# Altium footprint library MyPcbLib.PcbLib: 657 footprints (part 35 of 42)
Each footprint in its own frame and in the unit in brackets; x right, y up, seen from the top. Pads: shape width x height; smd on the part's side, far side on the other; paste and mask are expansions set on the pad; w line width, h text height; cw(c..) or ccw(c..) is an arc to the next point about the centre after c.
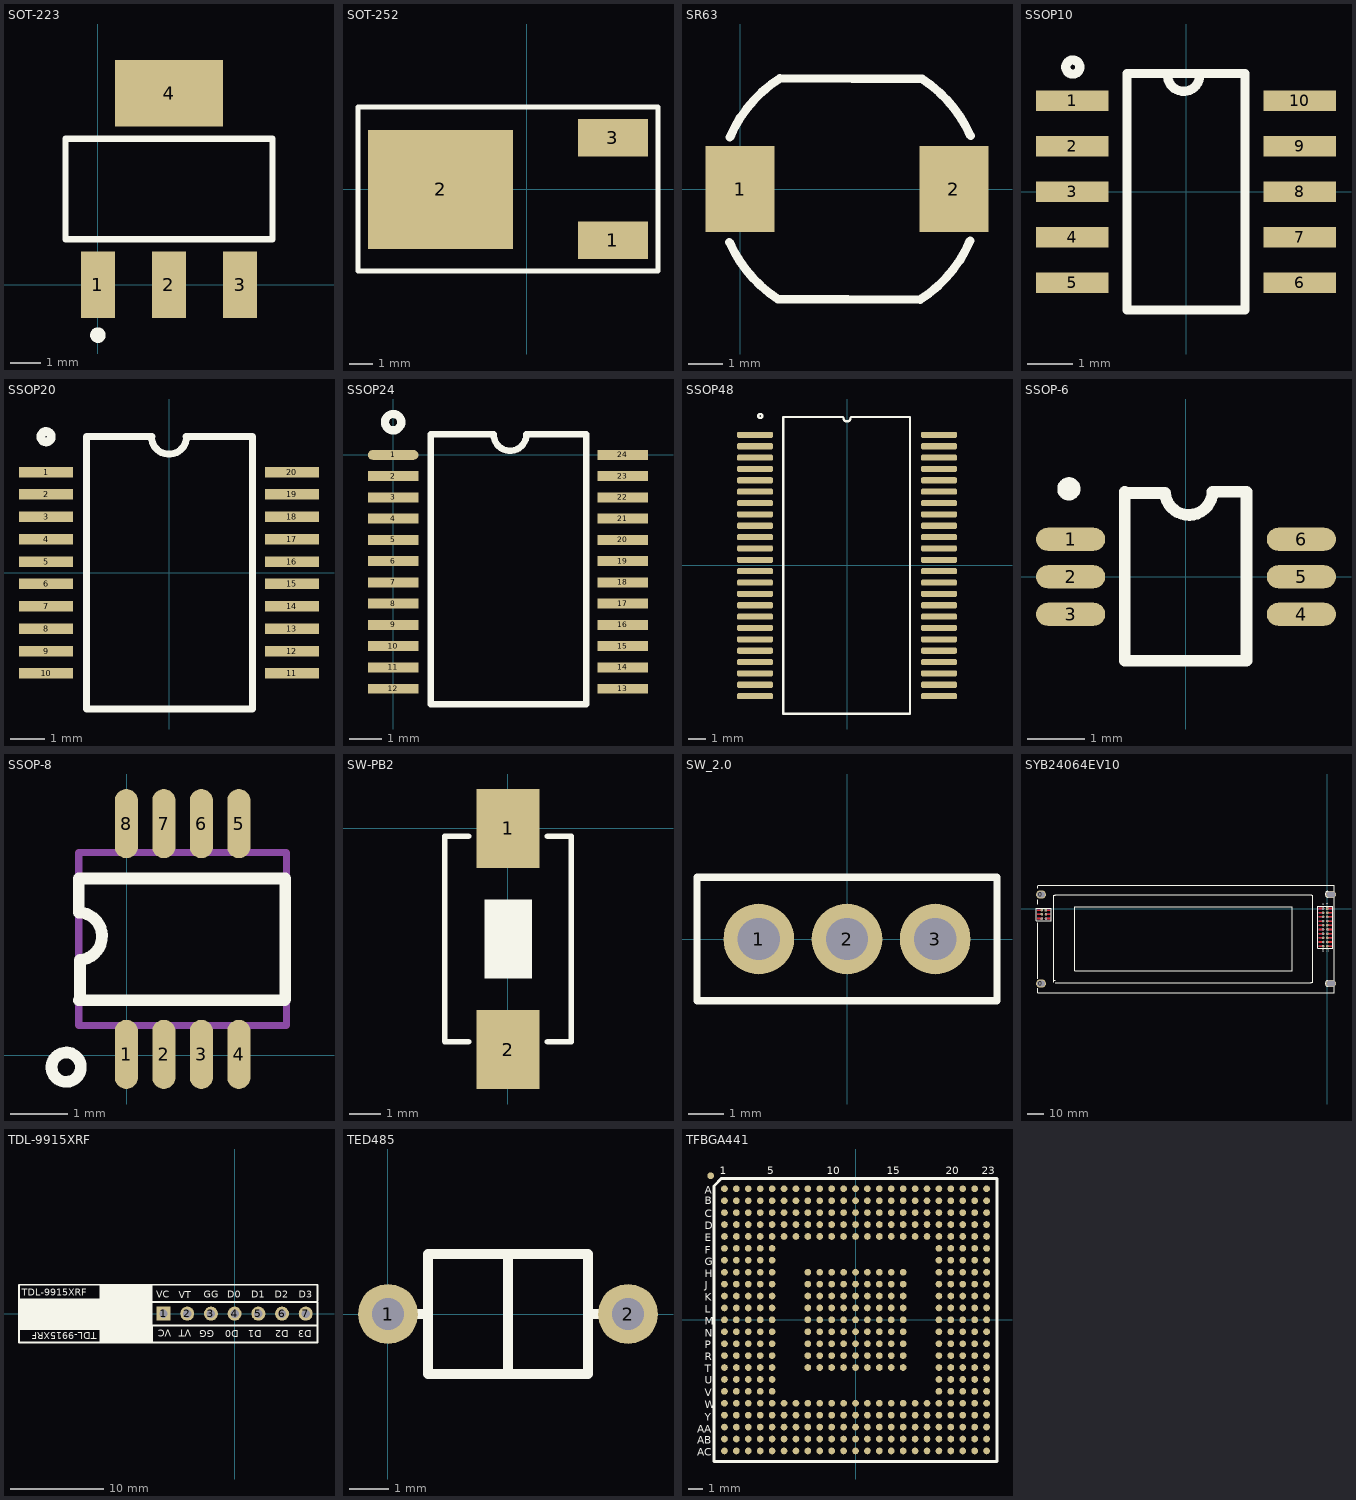
[diagram p34: the footprints below, top view; thin cyan lines are the x and y axes]

## SOT-223 [mm]
pads (4):
  rect 1.1x2.15 smd: 1(0,0) 2(2.3,0) 3(4.6,0)
  rect 3.5x2.15 smd: 4(2.3,6.2)
Top Overlay:
  circle w0.25: c0,-1.625 r0.125
  lines w0.2: -1.05,1.475 -1.05,4.725 5.65,4.725 5.65,1.475 -1.05,1.475
3D body: height 1.65, standoff -0.03, extent -0.951,-0.48 5.549,6.48

## SOT-252 [mm]
pads (3):
  rect 3x1.6 smd: 1(3.677,-2.184) 3(3.677,2.184)
  rect 6.2x5.08 smd: 2(-3.677,-0.013)
Top Overlay:
  lines w0.203: 5.6,-3.5 -7.2,-3.5 -7.2,3.5 5.6,3.5 ; 5.6,-3.454 5.6,3.454

## SR63 [mil]
pads (2):
  rect 80x100 smd: 1(0,0) 2(248.03,0)
Top Overlay:
  lines w10: -12.42,-61.6 ccw(c126.88,0) 43.69,-127.59 208.93,-128.33 ccw(c126.88,0) 266.88,-60 ; -11.88,60 cw(c128.12,0) 46.07,128.33 211.31,127.59 cw(c128.12,0) 267.42,61.6

## SS01 [mm]

## SSOP10 [mm]
pads (10):
  rect 1.6x0.45 smd: 1(-2.5,2) 2(-2.5,1) 3(-2.5,0) 4(-2.5,-1) 5(-2.5,-2) 6(2.5,-2) 7(2.5,-1) 8(2.5,0) 9(2.5,1) 10(2.5,2)
Top Overlay:
  circle w0.203: c-2.489,2.743 r0.155
  lines w0.203: -0.405,2.595 ccw(c-0.051,2.565) 0.305,2.565 ; -1.295,-2.6 -1.295,2.6 1.295,2.6 1.295,-2.6 -1.295,-2.6

## SSOP20 [mil]
pads (20):
  rect 62x12 smd: 1(-140.5,115.16) 2(-140.5,89.57) 3(-140.5,63.98) 4(-140.5,38.39) 5(-140.5,12.8) 6(-140.5,-12.8) 7(-140.5,-38.39) 8(-140.5,-63.98) 9(-140.5,-89.57) 10(-140.5,-115.16) 11(140.5,-115.16) 12(140.5,-89.57) 13(140.5,-63.98) 14(140.5,-38.39) 15(140.5,-12.8) 16(140.5,12.8) 17(140.5,38.39) 18(140.5,63.98) 19(140.5,89.57) 20(140.5,115.16)
Top Overlay:
  circle w10: c-140.5,155.51 r5.91
  lines w8: -20,155.51 ccw(c0,155.51) 20,155.51 ; -19.5,155.51 -94.5,155.51 -94.5,-155.51 95.5,-155.51 95.5,155.51 19.68,155.51

## SSOP24 [mil]
pads (24):
  oval 62x12 smd: 1(0,0)
  rect 62x12 smd: 2(0,-26) 3(0,-52) 4(0,-78) 5(0,-104) 6(0,-130) 7(0,-156) 8(0,-182) 9(0,-208) 10(0,-234) 11(0,-260) 12(0,-286) 13(281,-286) 14(281,-260) 15(281,-234) 16(281,-208) 17(281,-182) 18(281,-156) 19(281,-130) 20(281,-104) 21(281,-78) 22(281,-52) 23(281,-26) 24(281,0)
Top Overlay:
  circle w10: c0,40 r10
  lines w8: 121,25 46,25 46,-305 236,-305 236,25 166,25 ; 123,25 ccw(c143,25) 163,25

## SSOP48 [mil]
pads (48):
  rrect50% 78.74x13.5 smd: 1(-202.5,287.5) 2(-202.5,262.5) 3(-202.5,237.5) 4(-202.5,212.5) 5(-202.5,187.5) 6(-202.5,162.5) 7(-202.5,137.5) 8(-202.5,112.5) 9(-202.5,87.5) 10(-202.5,62.5) 11(-202.5,37.5) 12(-202.5,12.5) 13(-202.5,-12.5) 14(-202.5,-37.5) 15(-202.5,-62.5) 16(-202.5,-87.5) 17(-202.5,-112.5) 18(-202.5,-137.5) 19(-202.5,-162.5) 20(-202.5,-187.5) 21(-202.5,-212.5) 22(-202.5,-237.5) 23(-202.5,-262.5) 24(-202.5,-287.5) 25(202.5,-287.5) 26(202.5,-262.5) 27(202.5,-237.5) 28(202.5,-212.5) 29(202.5,-187.5) 30(202.5,-162.5) 31(202.5,-137.5) 32(202.5,-112.5) 33(202.5,-87.5) 34(202.5,-62.5) 35(202.5,-37.5) 36(202.5,-12.5) 37(202.5,12.5) 38(202.5,37.5) 39(202.5,62.5) 40(202.5,87.5) 41(202.5,112.5) 42(202.5,137.5) 43(202.5,162.5) 44(202.5,187.5) 45(202.5,212.5) 46(202.5,237.5) 47(202.5,262.5) 48(202.5,287.5)
Top Overlay:
  circle w5: c-191,329 r4.47
  lines w5: -140.5,-326.67 -140.5,326.87 ; -140,327 -9,327 ; -139.5,-326.5 138.5,-326.5 ; -7.87,325 ccw(c0,325) 7.87,325 ; 9,327 138,327 ; 138.72,-326.67 138.72,326.87

## SSOP-6 [mm]
pads (6):
  oval 1.2x0.4 smd: 1(-2,0.65) 2(-2,0) 3(-2,-0.65) 4(2,-0.65) 5(2,0) 6(2,0.65)
Top Overlay:
  circle w0.203: c-2.03,1.524 r0.1
  lines w0.203: -1.06,-1.453 -1.06,1.475 ; -1.05,-1.453 1.05,-1.453 1.05,1.475 0.46,1.475 cw(c0.048,1.484) -0.363,1.453 -1.038,1.453

## SSOP-8 [mm]
pads (8):
  oval 0.4x1.2 smd: 1(-0.01,0.012) 2(0.64,0.012) 3(1.29,0.012) 4(1.94,0.012) 5(1.94,4.012) 6(1.29,4.012) 7(0.64,4.012) 8(-0.01,4.012)
Top Overlay:
  circle w0.203: c-1.053,-0.21 r0.254
  lines w0.203: -0.835,0.952 2.735,0.952 ; -0.813,0.974 -0.813,1.649 ccw(c-0.844,2.06) -0.835,2.472 -0.835,3.062 2.745,3.062 2.745,0.962
Mechanical 1:
  lines w0.127: -0.835,0.512 -0.835,3.512 2.765,3.512 2.765,0.512 -0.835,0.512

## SW-PB2 [mm]
pads (2):
  rect 2x2.5 smd: 1(0.007,-0.002) 2(0.007,-7.002)
Top Overlay:
  region: -0.74,-2.249 -0.74,-4.749 0.76,-4.749 0.76,-2.249
  lines w0.178: -1.243,-6.752 -1.993,-6.748 -1.993,-0.252 -1.243,-0.252 ; 1.257,-6.752 2.007,-6.752 2.007,-0.252 1.257,-0.252

## SW_2.0 [mm]
pads (3):
  round 2 hole 1.2: 1(-2.5,0) 2(0,0) 3(2.5,0)
Top Overlay:
  lines w0.203: -4.25,-1.75 -4.25,1.75 4.25,1.75 4.25,-1.75 -4.25,-1.75

## SYB24064EV10 [mil]
pads (30):
  oval 236.22x196.85 hole 137.8 slot 177.17 at 0 deg: 0(-6839.57,-1791.81) 0(-6839.57,334.17)
  round 60 hole 42: 0(-6819,-139.37) 0(-6719,-139.37) 2(-100,0) 3(0,-100) 4(-100,-100) 5(0,-200) 6(-100,-200) 7(0,-300) 8(-100,-300) 9(0,-400) 10(-100,-400) 11(0,-500) 12(-100,-500) 13(0,-600) 14(-100,-600) 15(0,-700) 16(-100,-700) 17(0,-800) 18(-100,-800) 19(0,-900) 20(-100,-900) 21(-6819,-39.37) 22(-6819,-239.37) 22(-6719,-239.37)
  oval 236.22x157.48 hole 137.8 slot 196.85 at 0 deg: 0(89.57,-1791.81) 0(89.57,334.17)
  rect 60x60 hole 42: 1(0,0) 21(-6719,-39.37)
Top Layer:
  rectangle: -211,-21 -81,19
  rectangle: -211,-120.89 -81,-80.89
  rectangle: -211,-320.67 -81,-280.67
  rectangle: -211,-220.78 -81,-180.78
  rectangle: -211,-620.33 -81,-580.33
  rectangle: -211,-720.22 -81,-680.22
  rectangle: -211,-520.44 -81,-480.44
  rectangle: -211,-420.56 -81,-380.56
  rectangle: -211,-920 -81,-880
  rectangle: -211,-820.11 -81,-780.11
  rectangle: -20,-820.11 110,-780.11
  rectangle: -20,-920 110,-880
  rectangle: -20,-420.56 110,-380.56
  rectangle: -20,-520.44 110,-480.44
  rectangle: -20,-720.22 110,-680.22
  rectangle: -20,-620.33 110,-580.33
  rectangle: -20,-220.78 110,-180.78
  rectangle: -20,-320.67 110,-280.67
  rectangle: -20,-120.89 110,-80.89
  rectangle: -20,-21 110,19
  rectangle: -6930,-60.37 -6800,-20.37
  rectangle: -6930,-160.26 -6800,-120.26
  rectangle: -6930,-260.15 -6800,-220.15
  rectangle: -6739,-260.15 -6609,-220.15
  rectangle: -6739,-160.26 -6609,-120.26
  rectangle: -6739,-60.37 -6609,-20.37
Bottom Layer:
  rectangle: -20,-21 110,19
  rectangle: -20,-120.89 110,-80.89
  rectangle: -20,-320.67 110,-280.67
  rectangle: -20,-220.78 110,-180.78
  rectangle: -20,-620.33 110,-580.33
  rectangle: -20,-720.22 110,-680.22
  rectangle: -20,-520.45 110,-480.45
  rectangle: -20,-420.56 110,-380.56
  rectangle: -20,-920 110,-880
  rectangle: -20,-820.11 110,-780.11
  rectangle: -211,-820.11 -81,-780.11
  rectangle: -211,-920 -81,-880
  rectangle: -211,-420.56 -81,-380.56
  rectangle: -211,-520.45 -81,-480.45
  rectangle: -211,-720.22 -81,-680.22
  rectangle: -211,-620.33 -81,-580.33
  rectangle: -211,-220.78 -81,-180.78
  rectangle: -211,-320.67 -81,-280.67
  rectangle: -211,-120.89 -81,-80.89
  rectangle: -211,-21 -81,19
  rectangle: -6739,-60.37 -6609,-20.37
  rectangle: -6739,-160.26 -6609,-120.26
  rectangle: -6739,-260.15 -6609,-220.15
  rectangle: -6930,-260.15 -6800,-220.15
  rectangle: -6930,-160.26 -6800,-120.26
  rectangle: -6930,-60.37 -6800,-20.37
Top Overlay:
  circle w5: c-6839.57,-1791.81 r68.9
  lines w5: -6529,-1762 -6529,315 -6497,315 -6497,325 -376,325 -376,315 -347,315 -347,-1763 -378,-1763 -378,-1771 -6498,-1771 ; -6529,-1709 -6498,-1709 -6498,-1718 ; -6034,42 -6034,-1492 -838,-1492 -838,42 -6032,42
  lines w10: -6920,106.92 -6920,204.92 ; -6920,484.92 -6920,528.92 ; -6918.61,-1906.69 -6918.61,-2007.87 167.32,-2007.87 167.32,551.18 ; -6918.61,-1679.69 -6918.61,-728.35 ; -6918.61,-732.08 -6918.61,-338.69 ; -6918.61,551.18 168,551.18 ; 95,-1721 164.18,-1721 ; 100,-1721 8,-1721 ccw(c8,-1770) -41,-1770 -41,-1809 ccw(c8,-1809) 8,-1858 103,-1858 167.14,-1858 ; 164.18,408 103,408 9,408 ccw(c9,359) -40,359 -40,321 ccw(c9,321) 9,272 104,272 166.18,272 ; -6946.17,-289.37 -6591.83,-289.37 -6591.83,10.63 -6946.17,10.63 -6946.17,-289.37 ; -227.17,-950 127.17,-950 127.17,50 -227.17,50 -227.17,-950
  text "20" at -69,-1048 h50
  text "19" at 33,-1041 h50
  text "1" at 25,87 h50
  text "2" at -74,78 h50
Bottom Overlay:
  text "19" at 33,-961 h50
  text "20" at -69,-968 h50
  text "1" at 25,117 h50
  text "2" at -74,108 h50
Top Paste:
  rectangle: -211,-21 -81,19
  rectangle: -211,-120.89 -81,-80.89
  rectangle: -211,-320.67 -81,-280.67
  rectangle: -211,-220.78 -81,-180.78
  rectangle: -211,-620.33 -81,-580.33
  rectangle: -211,-720.22 -81,-680.22
  rectangle: -211,-520.44 -81,-480.44
  rectangle: -211,-420.56 -81,-380.56
  rectangle: -211,-920 -81,-880
  rectangle: -211,-820.11 -81,-780.11
  rectangle: -20,-820.11 110,-780.11
  rectangle: -20,-920 110,-880
  rectangle: -20,-420.56 110,-380.56
  rectangle: -20,-520.44 110,-480.44
  rectangle: -20,-720.22 110,-680.22
  rectangle: -20,-620.33 110,-580.33
  rectangle: -20,-220.78 110,-180.78
  rectangle: -20,-320.67 110,-280.67
  rectangle: -20,-120.89 110,-80.89
  rectangle: -20,-21 110,19
  rectangle: -6930,-60.37 -6800,-20.37
  rectangle: -6930,-160.26 -6800,-120.26
  rectangle: -6930,-260.15 -6800,-220.15
  rectangle: -6739,-260.15 -6609,-220.15
  rectangle: -6739,-160.26 -6609,-120.26
  rectangle: -6739,-60.37 -6609,-20.37
Bottom Paste:
  rectangle: -20,-21 110,19
  rectangle: -20,-120.89 110,-80.89
  rectangle: -20,-320.67 110,-280.67
  rectangle: -20,-220.78 110,-180.78
  rectangle: -20,-620.33 110,-580.33
  rectangle: -20,-720.22 110,-680.22
  rectangle: -20,-520.45 110,-480.45
  rectangle: -20,-420.56 110,-380.56
  rectangle: -20,-920 110,-880
  rectangle: -20,-820.11 110,-780.11
  rectangle: -211,-820.11 -81,-780.11
  rectangle: -211,-920 -81,-880
  rectangle: -211,-420.56 -81,-380.56
  rectangle: -211,-520.45 -81,-480.45
  rectangle: -211,-720.22 -81,-680.22
  rectangle: -211,-620.33 -81,-580.33
  rectangle: -211,-220.78 -81,-180.78
  rectangle: -211,-320.67 -81,-280.67
  rectangle: -211,-120.89 -81,-80.89
  rectangle: -211,-21 -81,19
  rectangle: -6739,-60.37 -6609,-20.37
  rectangle: -6739,-160.26 -6609,-120.26
  rectangle: -6739,-260.15 -6609,-220.15
  rectangle: -6930,-260.15 -6800,-220.15
  rectangle: -6930,-160.26 -6800,-120.26
  rectangle: -6930,-60.37 -6800,-20.37
Top Solder:
  rectangle: -215,-25 -77,23
  rectangle: -215,-124.89 -77,-76.89
  rectangle: -215,-324.67 -77,-276.67
  rectangle: -215,-224.78 -77,-176.78
  rectangle: -215,-624.33 -77,-576.33
  rectangle: -215,-724.22 -77,-676.22
  rectangle: -215,-524.44 -77,-476.44
  rectangle: -215,-424.56 -77,-376.56
  rectangle: -215,-924 -77,-876
  rectangle: -215,-824.11 -77,-776.11
  rectangle: -24,-824.11 114,-776.11
  rectangle: -24,-924 114,-876
  rectangle: -24,-424.56 114,-376.56
  rectangle: -24,-524.44 114,-476.44
  rectangle: -24,-724.22 114,-676.22
  rectangle: -24,-624.33 114,-576.33
  rectangle: -24,-224.78 114,-176.78
  rectangle: -24,-324.67 114,-276.67
  rectangle: -24,-124.89 114,-76.89
  rectangle: -24,-25 114,23
  rectangle: -6934,-64.37 -6796,-16.37
  rectangle: -6934,-164.26 -6796,-116.26
  rectangle: -6934,-264.15 -6796,-216.15
  rectangle: -6743,-264.15 -6605,-216.15
  rectangle: -6743,-164.26 -6605,-116.26
  rectangle: -6743,-64.37 -6605,-16.37
Bottom Solder:
  rectangle: -24,-25 114,23
  rectangle: -24,-124.89 114,-76.89
  rectangle: -24,-324.67 114,-276.67
  rectangle: -24,-224.78 114,-176.78
  rectangle: -24,-624.33 114,-576.33
  rectangle: -24,-724.22 114,-676.22
  rectangle: -24,-524.45 114,-476.45
  rectangle: -24,-424.56 114,-376.56
  rectangle: -24,-924 114,-876
  rectangle: -24,-824.11 114,-776.11
  rectangle: -215,-824.11 -77,-776.11
  rectangle: -215,-924 -77,-876
  rectangle: -215,-424.56 -77,-376.56
  rectangle: -215,-524.45 -77,-476.45
  rectangle: -215,-724.22 -77,-676.22
  rectangle: -215,-624.33 -77,-576.33
  rectangle: -215,-224.78 -77,-176.78
  rectangle: -215,-324.67 -77,-276.67
  rectangle: -215,-124.89 -77,-76.89
  rectangle: -215,-25 -77,23
  rectangle: -6743,-64.37 -6605,-16.37
  rectangle: -6743,-164.26 -6605,-116.26
  rectangle: -6743,-264.15 -6605,-216.15
  rectangle: -6934,-264.15 -6796,-216.15
  rectangle: -6934,-164.26 -6796,-116.26
  rectangle: -6934,-64.37 -6796,-16.37

## TDL-9915XRF [mm] "TDL-9915XRF"
pads (7):
  rect 1.5x1.5 hole 0.9: 1(-7.62,0)
  round 1.5 hole 0.9: 2(-5.08,0) 3(-2.54,0) 4(0,0) 5(2.54,0) 6(5.08,0) 7(7.62,0)
Top Overlay:
  rectangle: -14.503,-3.175 -8.865,3.105
  rectangle: -23.089,-1.753 -14.097,1.6
  lines w0.2: -8.865,-1.27 8.915,-1.27 ; -8.89,-1.27 -8.89,1.27 8.89,1.27 8.89,-1.27 -8.89,-1.27
  lines w0.203: -8.89,1.394 -8.89,3.105 8.869,3.105 ; -8.865,-3.073 -23.114,-3.073 -23.114,3.105 8.869,3.105 ; -8.865,-1.394 -8.865,-3.105 8.894,-3.105 8.894,-1.402 8.886,-1.394 ; 8.861,1.394 8.869,1.402 8.869,3.105
  text "D3" at 8.28,-2.54 h0.76
  text "D2" at 5.817,-1.803 h0.76
  text "D1" at 2.921,-1.778 h0.76
  text "D0" at 0.457,-1.778 h0.76
  text "GG" at -2.184,-1.778 h0.76
  text "VT" at -4.674,-1.727 h0.76
  text "VC" at -6.782,-1.727 h0.76
  text "VC" at -8.407,1.727 h0.76
  text "VT" at -5.994,1.676 h0.76
  text "GG" at -3.327,1.702 h0.76
  text "D0" at -0.787,1.702 h0.76
  text "D1" at 1.778,1.702 h0.76
  text "D2" at 4.318,1.727 h0.76
  text "D3" at 6.858,1.702 h0.76
  text "TDL-9915XRF" at -22.809,1.905 h0.76
  text "TDL-9915XRF" at -14.757,-1.981 h0.76

## TED485 [mil]
pads (2):
  round 60 hole 32: 1(0.2,0.4) 2(240.2,0.4)
Top Overlay:
  lines w10: 0.2,0.4 40.2,0.4 ; 120.2,-59.6 120.2,60.4 ; 200.2,0.4 240.2,0.4 ; 40.2,-59.6 60.2,-59.6 200.2,-59.6 200.2,60.4 40.2,60.4 40.2,-59.6

## TFBGA441 [mm]
pads (442):
  round 0.45 smd: A1(-8.8,8.8) A2(-8,8.8) A3(-7.2,8.8) A4(-6.4,8.8) A5(-5.6,8.8) A6(-4.8,8.8) A7(-4,8.8) A8(-3.2,8.8) A9(-2.4,8.8) A10(-1.6,8.8) A11(-0.8,8.8) A12(0,8.8) A13(0.8,8.8) A14(1.6,8.8) A15(2.4,8.8) A16(3.2,8.8) A17(4,8.8) A18(4.8,8.8) A19(5.6,8.8) A20(6.4,8.8) A21(7.2,8.8) A22(8,8.8) A23(8.8,8.8) AA1(-8.8,-7.2) AA2(-8,-7.2) AA3(-7.2,-7.2) AA4(-6.4,-7.2) AA5(-5.6,-7.2) AA6(-4.8,-7.2) AA7(-4,-7.2) AA8(-3.2,-7.2) AA9(-2.4,-7.2) AA10(-1.6,-7.2) AA11(-0.8,-7.2) AA12(0,-7.2) AA13(0.8,-7.2) AA14(1.6,-7.2) AA15(2.4,-7.2) AA16(3.2,-7.2) AA17(4,-7.2) AA18(4.8,-7.2) AA19(5.6,-7.2) AA20(6.4,-7.2) AA21(7.2,-7.2) AA22(8,-7.2) AA23(8.8,-7.2) AB1(-8.8,-8) AB2(-8,-8) AB3(-7.2,-8) AB4(-6.4,-8) AB5(-5.6,-8) AB6(-4.8,-8) AB7(-4,-8) AB8(-3.2,-8) AB9(-2.4,-8) AB10(-1.6,-8) AB11(-0.8,-8) AB12(0,-8) AB13(0.8,-8) AB14(1.6,-8) AB15(2.4,-8) AB16(3.2,-8) AB17(4,-8) AB18(4.8,-8) AB19(5.6,-8) AB20(6.4,-8) AB21(7.2,-8) AB22(8,-8) AB23(8.8,-8) AC1(-8.8,-8.8) AC2(-8,-8.8) AC3(-7.2,-8.8) AC4(-6.4,-8.8) AC5(-5.6,-8.8) AC6(-4.8,-8.8) AC7(-4,-8.8) AC8(-3.2,-8.8) AC9(-2.4,-8.8) AC10(-1.6,-8.8) AC11(-0.8,-8.8) AC12(0,-8.8) AC13(0.8,-8.8) AC14(1.6,-8.8) AC15(2.4,-8.8) AC16(3.2,-8.8) AC17(4,-8.8) AC18(4.8,-8.8) AC19(5.6,-8.8) AC20(6.4,-8.8) AC21(7.2,-8.8) AC22(8,-8.8) AC23(8.8,-8.8) B1(-8.8,8) B2(-8,8) B3(-7.2,8) B4(-6.4,8) B5(-5.6,8) B6(-4.8,8) B7(-4,8) B8(-3.2,8) B9(-2.4,8) B10(-1.6,8) B11(-0.8,8) B12(0,8) B13(0.8,8) B14(1.6,8) B15(2.4,8) B16(3.2,8) B17(4,8) B18(4.8,8) B19(5.6,8) B20(6.4,8) B21(7.2,8) B22(8,8) B23(8.8,8) C1(-8.8,7.2) C2(-8,7.2) C3(-7.2,7.2) C4(-6.4,7.2) C5(-5.6,7.2) C6(-4.8,7.2) C7(-4,7.2) C8(-3.2,7.2) C9(-2.4,7.2) C10(-1.6,7.2) C11(-0.8,7.2) C12(0,7.2) C13(0.8,7.2) C14(1.6,7.2) C15(2.4,7.2) C16(3.2,7.2) C17(4,7.2) C18(4.8,7.2) C19(5.6,7.2) C20(6.4,7.2) C21(7.2,7.2) C22(8,7.2) C23(8.8,7.2) D1(-8.8,6.4) D2(-8,6.4) D3(-7.2,6.4) D4(-6.4,6.4) D5(-5.6,6.4) D6(-4.8,6.4) D7(-4,6.4) D8(-3.2,6.4) D9(-2.4,6.4) D10(-1.6,6.4) D11(-0.8,6.4) D12(0,6.4) D13(0.8,6.4) D14(1.6,6.4) D15(2.4,6.4) D16(3.2,6.4) D17(4,6.4) D18(4.8,6.4) D19(5.6,6.4) D20(6.4,6.4) D21(7.2,6.4) D22(8,6.4) D23(8.8,6.4) E1(-8.8,5.6) E2(-8,5.6) E3(-7.2,5.6) E4(-6.4,5.6) E5(-5.6,5.6) E6(-4.8,5.6) E7(-4,5.6) E8(-3.2,5.6) E9(-2.4,5.6) E10(-1.6,5.6) E11(-0.8,5.6) E12(0,5.6) E13(0.8,5.6) E14(1.6,5.6) E15(2.4,5.6) E16(3.2,5.6) E17(4,5.6) E18(4.8,5.6) E19(5.6,5.6) E20(6.4,5.6) E21(7.2,5.6) E22(8,5.6) E23(8.8,5.6) F1(-8.8,4.8) F2(-8,4.8) F3(-7.2,4.8) F4(-6.4,4.8) F5(-5.6,4.8) F19(5.6,4.8) F20(6.4,4.8) F21(7.2,4.8) F22(8,4.8) F23(8.8,4.8) G1(-8.8,4) G2(-8,4) G3(-7.2,4) G4(-6.4,4) G5(-5.6,4) G19(5.6,4) G20(6.4,4) G21(7.2,4) G22(8,4) G23(8.8,4) H1(-8.8,3.2) H2(-8,3.2) H3(-7.2,3.2) H4(-6.4,3.2) H5(-5.6,3.2) H8(-3.2,3.2) H9(-2.4,3.2) H10(-1.6,3.2) H11(-0.8,3.2) H12(0,3.2) H13(0.8,3.2) H14(1.6,3.2) H15(2.4,3.2) H16(3.2,3.2) H19(5.6,3.2) H20(6.4,3.2) H21(7.2,3.2) H22(8,3.2) H23(8.8,3.2) J1(-8.8,2.4) J2(-8,2.4) J3(-7.2,2.4) J4(-6.4,2.4) J5(-5.6,2.4) J8(-3.2,2.4) J9(-2.4,2.4) J10(-1.6,2.4) J11(-0.8,2.4) J12(0,2.4) J13(0.8,2.4) J14(1.6,2.4) J15(2.4,2.4) J16(3.2,2.4) J19(5.6,2.4) J20(6.4,2.4) J21(7.2,2.4) J22(8,2.4) J23(8.8,2.4) K1(-8.8,1.6) K2(-8,1.6) K3(-7.2,1.6) K4(-6.4,1.6) K5(-5.6,1.6) K8(-3.2,1.6) K9(-2.4,1.6) K10(-1.6,1.6) K11(-0.8,1.6) K12(0,1.6) K13(0.8,1.6) K14(1.6,1.6) K15(2.4,1.6) K16(3.2,1.6) K19(5.6,1.6) K20(6.4,1.6) K21(7.2,1.6) K22(8,1.6) K23(8.8,1.6) L1(-8.8,0.8) L2(-8,0.8) L3(-7.2,0.8) L4(-6.4,0.8) L5(-5.6,0.8) L8(-3.2,0.8) L9(-2.4,0.8) L10(-1.6,0.8) L11(-0.8,0.8) L12(0,0.8) L13(0.8,0.8) L14(1.6,0.8) L15(2.4,0.8) L16(3.2,0.8) L19(5.6,0.8) L20(6.4,0.8) L21(7.2,0.8) L22(8,0.8) L23(8.8,0.8) M1(-8.8,0) M2(-8,0) M3(-7.2,0) M4(-6.4,0) M5(-5.6,0) M8(-3.2,0) M9(-2.4,0) M10(-1.6,0) M11(-0.8,0) M12(0,0) M13(0.8,0) M14(1.6,0) M15(2.4,0) M16(3.2,0) M19(5.6,0) M20(6.4,0) M21(7.2,0) M22(8,0) M23(8.8,0) N1(-8.8,-0.8) N2(-8,-0.8) N3(-7.2,-0.8) N4(-6.4,-0.8) N5(-5.6,-0.8) N8(-3.2,-0.8) N9(-2.4,-0.8) N10(-1.6,-0.8) N11(-0.8,-0.8) N12(0,-0.8) N13(0.8,-0.8) N14(1.6,-0.8) N15(2.4,-0.8) N16(3.2,-0.8) N19(5.6,-0.8) N20(6.4,-0.8) N21(7.2,-0.8) N22(8,-0.8) N23(8.8,-0.8) P1(-8.8,-1.6) P2(-8,-1.6) P3(-7.2,-1.6) P4(-6.4,-1.6) P5(-5.6,-1.6) P8(-3.2,-1.6) P9(-2.4,-1.6) P10(-1.6,-1.6) P11(-0.8,-1.6) P12(0,-1.6) P13(0.8,-1.6) P14(1.6,-1.6) P15(2.4,-1.6) P16(3.2,-1.6) P19(5.6,-1.6) P20(6.4,-1.6) P21(7.2,-1.6) P22(8,-1.6) P23(8.8,-1.6) R1(-8.8,-2.4) R2(-8,-2.4) R3(-7.2,-2.4) R4(-6.4,-2.4) R5(-5.6,-2.4) R8(-3.2,-2.4) R9(-2.4,-2.4) R10(-1.6,-2.4) R11(-0.8,-2.4) R12(0,-2.4) R13(0.8,-2.4) R14(1.6,-2.4) R15(2.4,-2.4) R16(3.2,-2.4) R19(5.6,-2.4) R20(6.4,-2.4) R21(7.2,-2.4) R22(8,-2.4) R23(8.8,-2.4) T1(-8.8,-3.2) T2(-8,-3.2) T3(-7.2,-3.2) T4(-6.4,-3.2) T5(-5.6,-3.2) T8(-3.2,-3.2) T9(-2.4,-3.2) T10(-1.6,-3.2) T11(-0.8,-3.2) T12(0,-3.2) T13(0.8,-3.2) T14(1.6,-3.2) T15(2.4,-3.2) T16(3.2,-3.2) T19(5.6,-3.2) T20(6.4,-3.2) T21(7.2,-3.2) T22(8,-3.2) T23(8.8,-3.2) U1(-8.8,-4) U2(-8,-4) U3(-7.2,-4) U4(-6.4,-4) U5(-5.6,-4) U19(5.6,-4) U20(6.4,-4) U21(7.2,-4) U22(8,-4) U23(8.8,-4) V1(-8.8,-4.8) V2(-8,-4.8) V3(-7.2,-4.8) V4(-6.4,-4.8) V5(-5.6,-4.8) V19(5.6,-4.8) V20(6.4,-4.8) V21(7.2,-4.8) V22(8,-4.8) V23(8.8,-4.8) W1(-8.8,-5.6) W2(-8,-5.6) W3(-7.2,-5.6) W4(-6.4,-5.6) W5(-5.6,-5.6) W6(-4.8,-5.6) W7(-4,-5.6) W8(-3.2,-5.6) W9(-2.4,-5.6) W10(-1.6,-5.6) W11(-0.8,-5.6) W12(0,-5.6) W13(0.8,-5.6) W14(1.6,-5.6) W15(2.4,-5.6) W16(3.2,-5.6) W17(4,-5.6) W18(4.8,-5.6) W19(5.6,-5.6) W20(6.4,-5.6) W21(7.2,-5.6) W22(8,-5.6) W23(8.8,-5.6) Y1(-8.8,-6.4) Y2(-8,-6.4) Y3(-7.2,-6.4) Y4(-6.4,-6.4) Y5(-5.6,-6.4) Y6(-4.8,-6.4) Y7(-4,-6.4) Y8(-3.2,-6.4) Y9(-2.4,-6.4) Y10(-1.6,-6.4) Y11(-0.8,-6.4) Y12(0,-6.4) Y13(0.8,-6.4) Y14(1.6,-6.4) Y15(2.4,-6.4) Y16(3.2,-6.4) Y17(4,-6.4) Y18(4.8,-6.4) Y19(5.6,-6.4) Y20(6.4,-6.4) Y21(7.2,-6.4) Y22(8,-6.4) Y23(8.8,-6.4) ""(-9.728,9.677)
Top Overlay:
  lines w0.203: -9.5,-9.5 -9.5,8.991 -8.991,9.5 9.5,9.5 9.5,-9.5 -9.5,-9.5
  text "23" at 8.484,9.779 h0.51
  text "B" at -10.135,7.747 h0.51
  text "C" at -10.135,6.883 h0.51
  text "D" at -10.135,6.071 h0.51
  text "F" at -10.135,4.445 h0.51
  text "G" at -10.135,3.683 h0.51
  text "H" at -10.135,2.87 h0.51
  text "K" at -10.135,1.27 h0.51
  text "L" at -10.135,0.483 h0.51
  text "M" at -10.135,-0.33 h0.51
  text "P" at -10.135,-1.905 h0.51
  text "R" at -10.135,-2.718 h0.51
  text "T" at -10.135,-3.531 h0.51
  text "V" at -10.135,-5.131 h0.51
  text "W" at -10.135,-5.918 h0.51
  text "Y" at -10.135,-6.782 h0.51
  text "AB" at -10.643,-8.306 h0.51
  text "AC" at -10.643,-9.119 h0.51
  text "A" at -10.135,8.484 h0.51
  text "E" at -10.135,5.283 h0.51
  text "J" at -10.135,2.083 h0.51
  text "N" at -10.135,-1.118 h0.51
  text "U" at -10.135,-4.293 h0.51
  text "AA" at -10.643,-7.569 h0.51
  text "1" at -9.119,9.779 h0.51
  text "5" at -5.918,9.779 h0.51
  text "10" at -1.93,9.779 h0.51
  text "15" at 2.083,9.779 h0.51
  text "20" at 6.071,9.779 h0.51